# Altium footprint library PcbLib.PcbLib: 108 footprints (part 7 of 7)
Each footprint in its own frame and in the unit in brackets; x right, y up, seen from the top. Pads: shape width x height; smd on the part's side, far side on the other; paste and mask are expansions set on the pad; w line width, h text height; cw(c..) or ccw(c..) is an arc to the next point about the centre after c.
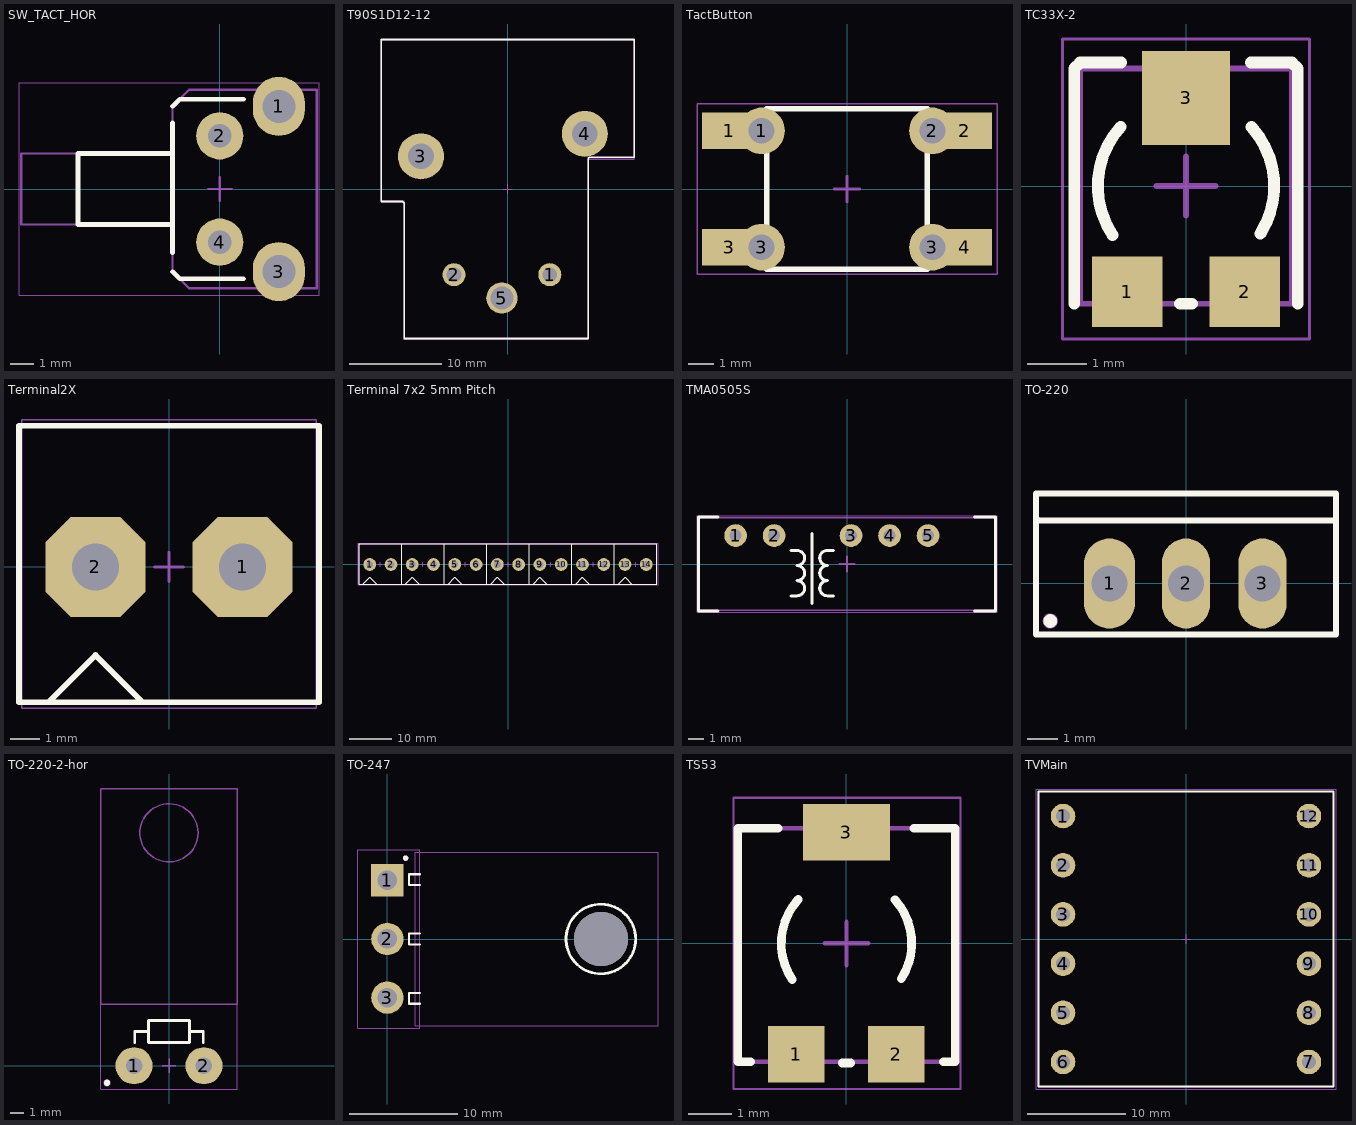
[diagram p6: the footprints below, top view; thin cyan lines are the x and y axes]

## SW_TACT_HOR [mm]
pads (4):
  oval 2.2x2.5 hole 1.4: 1(2.5,3.5) 3(2.5,-3.5)
  round 2 hole 1: 2(0,2.25) 4(0,-2.25)
Top Overlay:
  lines w0.2: -2,-3.5 -1.7,-3.8 1,-3.8 ; -2,-2.7 -2,2.8 ; -2,-1.5 -6,-1.5 -6,1.5 -2,1.5 ; -2,3.5 -1.7,3.8 1,3.8
Mechanical 13:
  lines w0.05: -8.5,-4.5 -8.5,4.5 4.2,4.5 4.2,-4.5 -8.5,-4.5
  lines w0.1: -0.5,0 0.5,0 ; 0,-0.5 0,0.5
Mechanical 14:
  lines w0.1: -2,-1.5 -8.4,-1.5 -8.4,1.5 -2,1.5 ; -2,-3.5 -2,3.5 -1.3,4.2 4.1,4.2 4.1,-4.2 -1.3,-4.2 -2,-3.5
3D body "Tact90Deg.step": height 7.37, standoff -3.5, extent -8.37,-4.184 4.1,4.183

## T90S1D12-12 [mm] "RELAY GEN PURPOSE SPST 30A"
height 20.5
pads (5):
  round 2.5 hole 1.6: 1(4.57,-9.31) 2(-5.85,-9.31)
  round 5 hole 2.8: 3(-9.43,3.55) 4(8.37,6)
  round 3.4 hole 2.5: 5(-0.64,-11.85)
Top Overlay:
  lines w0.2: -13.75,-1.35 -11.45,-1.35 -11.25,-1.55 -11.25,-16.25 8.75,-16.25 8.75,3.35 8.85,3.45 13.75,3.45 13.75,16.25 -13.75,16.25 -13.75,-1.35
Mechanical 13:
  lines w0.05: -13.75,-1.25 -11.25,-1.25 -11.25,-16.25 8.75,-16.25 8.75,3.25 13.75,3.25 13.75,16.25 -13.75,16.25 -13.75,-1.25
  lines w0.1: -0.5,0 0.5,0 ; 0,-0.5 0,0.5
Mechanical 14:
  lines w0.1: 13.7,16.2 -13.7,16.2 -13.7,-1.4 -11.2,-1.4 -11.2,-16.2 -11.3,-16.3 8.7,-16.3 8.8,-16.2 8.8,3.3 13.7,3.3 13.8,3.4 13.8,16.3
3D body "JQX105Fv1.STEP": height 20.46, standoff -2.95, extent -13.658,-16 13.742,16.2

## TactButton [mm] "TACTIC BUTTON PTS645 6x6"
height 5.05
pads (8):
  rect 2.1x1.4 smd: 1(-4.55,2.25) 2(4.55,2.25) 3(-4.55,-2.25) 4(4.55,-2.25)
  round 1.8 hole 1: 1(-3.3,2.25) 2(3.3,2.25) 3(-3.3,-2.25) 3(3.3,-2.25)
Top Overlay:
  lines w0.2: -3.1,-3.1 3.1,-3.1 3.1,3.1 -3.1,3.1 -3.1,-3.1
Mechanical 13:
  lines w0.05: -5.8,-3.3 -5.8,3.3 5.8,3.3 5.8,-3.3 -5.8,-3.3
  lines w0.1: -0.5,0 0.5,0 ; 0,-0.5 0,0.5
Mechanical 14:
  lines w0.1: -3.1,-3.1 3.1,-3.1 3.1,3.1 -3.1,3.1 -3.1,-3.1
3D body "User Library-PTS645SL43SMTR92-LFS.STEP": height 4.35, standoff 0.05, extent -4.5,-3 4.5,3

## TC33X-2 [mm] "Trimmer"
height 1.2
pads (3):
  rect 1.2x1.2 smd: 1(-1,-1.8) 2(1,-1.8)
  rect 1.5x1.6 smd: 3(0,1.5)
Top Overlay:
  lines w0.2: -1.9,-2 -1.9,-1.9 -1.9,2 -1.8,2.1 -1.1,2.1 ; -1.248,-0.832 cw(c0,0) -1.11,1.009 ; -0.1,-2 0.1,-2 ; 1.1,2.1 1.8,2.1 1.9,2 1.9,-1.8 1.9,-2 ; 1.115,1.003 cw(c0,0) 1.262,-0.811
Mechanical 13:
  lines w0.05: -2.1,-2.6 -2.1,2.5 2.1,2.5 2.1,-2.6 -2.1,-2.6
  lines w0.1: -0.5,0 0.5,0 ; 0,-0.5 0,0.5
Mechanical 14:
  lines w0.1: -1.8,-2 -1.8,2 1.8,2 1.8,-2 -1.8,-2
3D body "TC-33-2.step": height 1.16, standoff 0.01, extent -1.8,-1.913 1.8,2.05

## Terminal2X [mm] "Terminal BLOCK 5mm, 2 wires"
height 13.5
pads (2):
  oct 3.4x3.4 hole 1.6: 1(2.5,0) 2(-2.5,0)
Top Overlay:
  lines w0.2: -0.9,-4.6 -2.5,-3 ; -2.5,-3 -2.5,-3 ; -2.5,-3 -4.1,-4.6 -2.5,-3 ; -5.1,-4.6 5.1,-4.6 5.1,4.8 -4.5,4.8 -5.1,4.8 -5.1,-4.6
Mechanical 13:
  lines w0.05: -5,-4.8 -5,5 5,5 5,-4.8 -5,-4.8
  lines w0.1: -0.5,0 0.5,0 ; 0,-0.5 0,0.5
Mechanical 14:
  lines w0.1: -5.1,-4.6 -5.1,4.7 -5,4.8 -4.9,4.8 5.1,4.8 5.1,-4.6 -5.1,-4.6
3D body "User Library-CTB0108_2.step": height 13.9, standoff -3.4, extent -5.1,-4.7 5.1,5.1

## Terminal 7x2 5mm Pitch [mm] "Terminal BLOCK 5mm, 7x 2 wires"
height 13.5
pads (14):
  round 3 hole 1.6: 1(-32.5,0) 2(-27.5,0) 3(-22.5,0) 4(-17.5,0) 5(-12.5,0) 6(-7.5,0) 7(-2.5,0) 8(2.5,0) 9(7.5,0) 10(12.5,0) 11(17.5,0) 12(22.5,0) 13(27.5,0) 14(32.5,0)
Top Overlay:
  lines w0.2: -30.9,-4.6 -32.5,-3 ; -20.9,-4.6 -22.5,-3 ; -10.9,-4.6 -12.5,-3 ; -0.9,-4.6 -2.5,-3 ; 9.1,-4.6 7.5,-3 ; 19.1,-4.6 17.5,-3 ; 29.1,-4.6 27.5,-3 ; -32.5,-3 -32.5,-3 ; -32.5,-3 -34.1,-4.6 -32.5,-3 ; -25,-4.6 -25,4.8 ; -25,-4.6 -35,-4.6 -35,4.8 -34.5,4.8 -25,4.8 ; -25,-4.6 -15,-4.6 ; -25,-4.6 -25,4.8 ; -25,4.8 -24.5,4.8 -15,4.8 ; -22.5,-3 -22.5,-3 ; -22.5,-3 -24.1,-4.6 -22.5,-3 ; -15,-4.6 -15,4.8 ; -15,-4.6 -5,-4.6 ; -15,-4.6 -15,4.8 ; -15,4.8 -14.5,4.8 -5,4.8 ; -12.5,-3 -12.5,-3 ; -12.5,-3 -14.1,-4.6 -12.5,-3 ; -5,-4.6 -5,4.8 ; -5,-4.6 -5,4.8 ; -5,-4.6 5,-4.6 ; -5,4.8 -4.5,4.8 5,4.8 ; -2.5,-3 -4.1,-4.6 -2.5,-3 ; -2.5,-3 -2.5,-3 ; 5,-4.6 15,-4.6 ; 5,-4.6 5,4.8 ; 5,-4.6 5,4.8 ; 5,4.8 5.5,4.8 15,4.8 ; 7.5,-3 7.5,-3 ; 7.5,-3 5.9,-4.6 7.5,-3 ; 15,-4.6 25,-4.6 ; 15,-4.6 15,4.8 ; 15,-4.6 15,4.8 ; 15,4.8 15.5,4.8 25,4.8 ; 17.5,-3 17.5,-3 ; 17.5,-3 15.9,-4.6 17.5,-3 ; 25,-4.6 35,-4.6 35,4.8 25.5,4.8 25,4.8 ; 25,-4.6 25,4.8 ; 25,-4.6 25,4.8 ; 27.5,-3 27.5,-3 ; 27.5,-3 25.9,-4.6 27.5,-3
Mechanical 13:
  lines w0.05: -35.25,-4.8 35.25,-4.8 35.25,5 -35.25,5 -35.25,-4.8
  lines w0.1: -30.5,0 -29.5,0 ; -30,-0.5 -30,0.5 ; -20.5,0 -19.5,0 ; -20,-0.5 -20,0.5 ; -10.5,0 -9.5,0 ; -10,-0.5 -10,0.5 ; -0.5,0 0.5,0 ; 0,-0.5 0,0.5 ; 9.5,0 10.5,0 ; 10,-0.5 10,0.5 ; 19.5,0 20.5,0 ; 20,-0.5 20,0.5 ; 29.5,0 30.5,0 ; 30,-0.5 30,0.5
Mechanical 14:
  lines w0.1: -35,-4.6 35,-4.6 35,4.8 -4.9,4.8 -35,4.8 -35,-4.6
3D body "User Library-CTB0108_2.step": height 13.9, standoff -3.4, extent -35.1,-4.7 -24.9,5.1
3D body "User Library-CTB0108_2.step": height 13.9, standoff -3.4, extent -25.1,-4.7 -14.9,5.1
3D body "User Library-CTB0108_2.step": height 13.9, standoff -3.4, extent -15.1,-4.7 -4.9,5.1
3D body "User Library-CTB0108_2.step": height 13.9, standoff -3.4, extent 24.9,-4.7 35.1,5.1
3D body "User Library-CTB0108_2.step": height 13.9, standoff -3.4, extent 14.9,-4.7 25.1,5.1
3D body "User Library-CTB0108_2.step": height 13.9, standoff -3.4, extent 4.9,-4.7 15.1,5.1
3D body "User Library-CTB0108_2.step": height 13.9, standoff -3.4, extent -5.1,-4.7 5.1,5.1

## TMA0505S [mm] "DC/DC converter(isolated)1-2W"
height 10.2
pads (5):
  round 1.5 hole 0.8: 1(-7.35,1.875) 2(-4.81,1.875) 3(0.27,1.875) 4(2.81,1.875) 5(5.35,1.875)
Top Overlay:
  lines w0.2: -8.5,-3.1 -9.8,-3.1 -9.8,3.1 -8.5,3.1 ; -3.7,-2.1 -3.3,-2.1 ccw(c-3.3,-1.6) -3.3,-1.1 ccw(c-3.3,-0.6) -3.3,-0.1 ccw(c-3.3,0.4) -3.3,0.9 -3.7,0.9 ; -2.3,-2.6 -2.3,2 ; -0.9,-2.1 -1.3,-2.1 cw(c-1.3,-1.6) -1.3,-1.1 cw(c-1.3,-0.6) -1.3,-0.1 cw(c-1.3,0.4) -1.3,0.9 -0.9,0.9 ; 8.4,-3.1 9.8,-3.1 9.8,3.1 8.4,3.1
Mechanical 13:
  lines w0.05: -9.9,-3.2 -9.9,3.2 9.9,3.2 9.9,-3.2 -9.9,-3.2
  lines w0.1: -0.5,0 0.5,0 ; 0,-0.5 0,0.5
Mechanical 14:
  lines w0.1: -9.75,-3.05 9.75,-3.05 9.75,3.05 -9.75,3.05 -9.75,-3.05
3D body "TracoTMA 0505S.step": height 10.2, standoff -3.2, extent -9.75,-3.07 9.75,3.05

## TO-220 [mm] "TO-220, 3x0.8 , P-2.54"
height 19
pads (3):
  oval 1.7x3 hole 1.2: 1(-2.55,0)
  oval 1.6x3 hole 1.2: 2(0,0) 3(2.55,0)
Top Overlay:
  circle w0.254: c-4.525,-1.25 r0.1
  lines w0.2: -5,2.2 -4.9,2.1 5,2.1 ; -5,-1.7 -5,3 5,3 5,-1.7 -5,-1.7
Mechanical 13:
  lines w0.05: -5,-1.7 -5,3 5,3 5,-1.7 -5,-1.7
  lines w0.1: -0.5,0 0.5,0 ; 0,-0.5 0,0.5
Mechanical 14:
  circle w0.1: c-4.525,-1.25 r0.206
  lines w0.1: -5,2.1 4.975,2.1 ; -5,-1.7 -5,2.975 5,2.975 5,-1.7 -5,-1.7
3D body "User Library-TO220-AB PCB.step": height 20.05, standoff -3.5, extent -4.95,-1.55 4.95,2.907

## TO-220-2-hor [mm] "TO-220, 3x0.8 , P-2.54"
height 19
pads (2):
  round 2.7 hole 1.2: 1(-2.55,0) 2(2.55,0)
Top Overlay:
  circle w0.254: c-4.525,-1.25 r0.1
  lines w0.2: -2.5,1.7 -2.5,2.5 -1.5,2.5 -1.5,3.3 1.5,3.3 1.5,1.7 -1.5,1.7 -1.5,2.7 ; 1.5,2.5 2.5,2.5 2.5,1.7
Mechanical 13:
  lines w0.05: -5,-1.7 -5,20.2 5,20.2 5,-1.7 -5,-1.7
  lines w0.1: -0.5,0 0.5,0 ; 0,-0.5 0,0.5
Mechanical 14:
  circle w0.1: c0,17 r2.121
  circle w0.1: c-4.525,-1.25 r0.206
  lines w0.1: -5,4.5 -5,20.2 5,20.2 5,4.5 -5,4.5
3D body "TO220-2_OR-INV.STEP": height 1.22, standoff -7, extent -5,-0.4 5,20.2

## TO-247 [mm] "FM, 3-Leads, Body 5.03x15.87mm, Pitch 5.44mm"
height -15
pads (3):
  rect 3x3 hole 1.8: 1(0,5.46)
  round 3 hole 1.8: 2(0,0.01) 3(0,-5.44)
via 19.8,0 diameter 5 hole 5
Top Overlay:
  circle w0.25: c1.7,7.5 r0.125
  circle w0.254: c19.8,0 r3.225
  lines w0.2: 3,-6 2,-6 2,-5 3,-5 ; 3,-0.5 2,-0.5 2,0.5 3,0.5 ; 3,5 2,5 2,6 3,6
Mechanical 13:
  lines w0.05: -2.72,-8.275 -2.72,8.275 3,8.275 3,-8.275 -2.72,-8.275
  lines w0.1: -0.5,0.01 0.5,0.01 ; 0,-0.49 0,0.51
Mechanical 14:
  lines w0.1: 2.6,-8.025 25.1,-8.025 25.1,8.025 2.6,8.025 2.6,-8.025
Mechanical 15:
  lines w0.1: -0.5,0 0.5,0 ; 0,-0.5 0,0.5
3D body "TO-247H.step": height 1.9, standoff -10, extent -0.3,-7.75 25.1,7.75

## TS53 [mm] "Trimmer"
height 2
pads (3):
  rect 1.3x1.3 smd: 1(-1.15,-2.55) 2(1.15,-2.55)
  rect 2x1.3 smd: 3(0,2.55)
Top Overlay:
  lines w0.2: -2.2,-2.725 -2.5,-2.725 -2.5,2.65 -1.575,2.65 ; -1.248,-0.832 cw(c0,0) -1.11,1.009 ; -0.1,-2.75 0.1,-2.75 ; 1.115,1.003 cw(c0,0) 1.262,-0.811 ; 1.55,2.65 2.5,2.65 2.5,-2.725 2.225,-2.725
Mechanical 13:
  lines w0.05: -2.6,-3.35 2.625,-3.35 2.625,3.35 -2.6,3.35 -2.6,-3.35
  lines w0.1: -0.5,0 0.5,0 ; 0,-0.5 0,0.5
Mechanical 14:
  lines w0.1: -2.5,-2.725 2.5,-2.725 2.5,2.65 -2.5,2.65 -2.5,-2.725
3D body "TS53.step": height 2.83, standoff 0.03, extent -2.5,-2.725 2.5,2.675

## TVMain [mm]
height 25
pads (12):
  round 2.5 hole 1.4: 1(-12.5,12.5) 2(-12.5,7.5) 3(-12.5,2.5) 4(-12.5,-2.5) 5(-12.5,-7.5) 6(-12.5,-12.5) 7(12.5,-12.5) 8(12.5,-7.5) 9(12.5,-2.5) 10(12.5,2.5) 11(12.5,7.5) 12(12.5,12.5)
Top Overlay:
  lines w0.2: -15,-15 15,-15 15,15 -15,15 -15,-15
Mechanical 13:
  lines w0.05: -15.25,-15.25 15.25,-15.25 15.25,15.25 -15.25,15.25 -15.25,-15.25
  lines w0.1: -0.5,0 0.5,0 ; 0,-0.5 0,0.5
Mechanical 14:
  lines w0.1: -15,-15 15,-15 15,15 -15,15 -15,-15
3D body "TRANS.STEP": height 23.7, standoff -2.9, extent -15.075,-15 15.075,15